# Altium footprint library AMLB_v1.PcbLib: 167 footprints (part 10 of 11)
Each footprint in its own frame and in the unit in brackets; x right, y up, seen from the top. Pads: shape width x height; smd on the part's side, far side on the other; paste and mask are expansions set on the pad; w line width, h text height; cw(c..) or ccw(c..) is an arc to the next point about the centre after c.
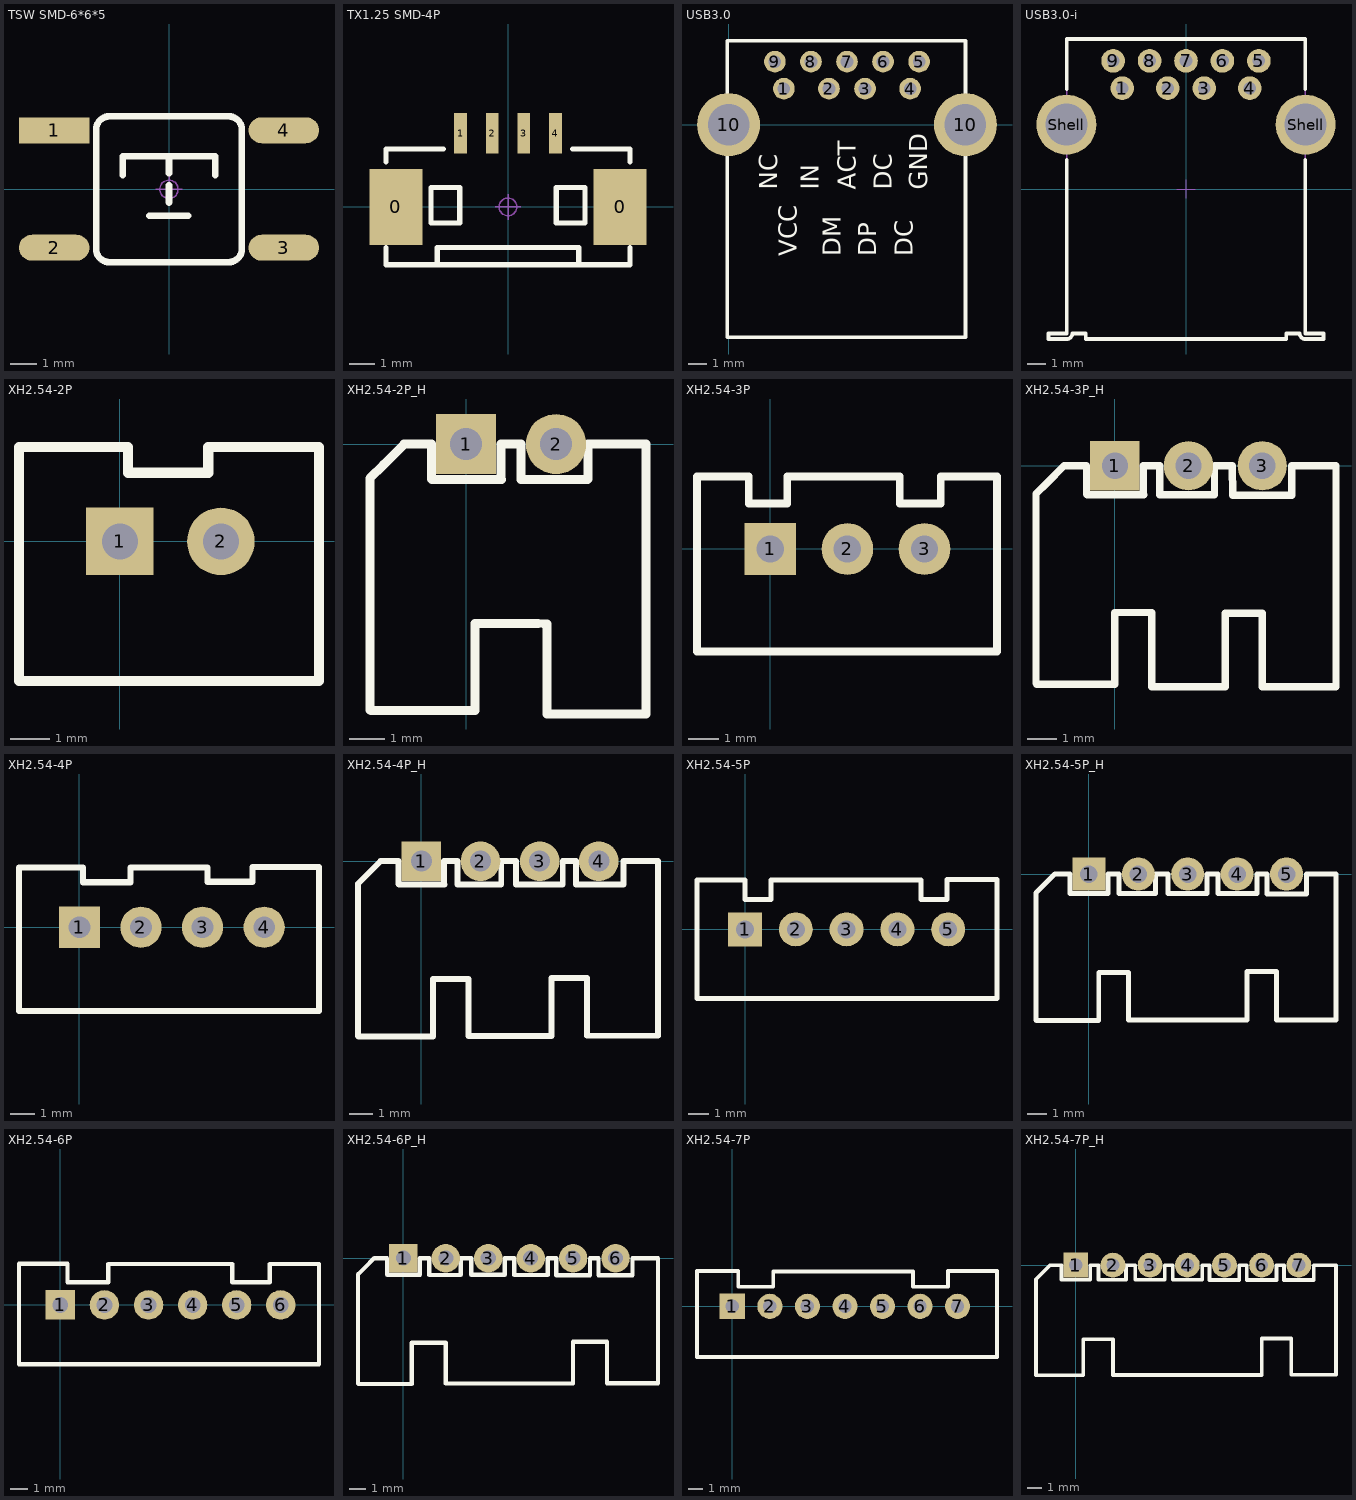
[diagram p9: the footprints below, top view; thin cyan lines are the x and y axes]

## TSW SMD-6*6*5 [mm] "6*6*5mm"
pads (4):
  rect 2.7x1 smd: 1(-4.4,2.261)
  oval 2.7x1 smd: 2(-4.4,-2.239) 3(4.4,-2.239) 4(4.4,2.261)
Top Overlay:
  lines w0.254: -1.778,0.533 -1.778,1.27 1.778,1.27 1.778,0.533 ; -0.762,-1.016 0.737,-1.016 ; 0,-0.508 0,0.152 ; 0,0.61 0,1.27 ; -2.794,-2.286 ccw(c-2.286,-2.286) -2.286,-2.794 2.286,-2.794 ccw(c2.286,-2.286) 2.794,-2.286 2.794,2.286 ccw(c2.286,2.286) 2.286,2.794 -2.286,2.794 ccw(c-2.286,2.286) -2.794,2.286 -2.794,-2.286
Mechanical 15:
  circle w0.05: c0,0 r0.35
  lines w0.05: -0.5,0 0.5,0 ; 0,-0.5 0,0.5
3D body "TSW SMD-6x6x5.STEP": height 4.95, standoff -0.03, extent -4.5,-3 4.5,3

## TX1.25 SMD-4P [mm] "4脚贴片，长：10.25mm，宽：4.4mm，高：3.5mm"
pads (6):
  rect 2.1x3 smd: 0(-4.425,0) 0(4.425,0)
  rect 0.5x1.6 smd: 1(-1.875,2.9) 2(-0.625,2.9) 3(0.625,2.9) 4(1.875,2.9)
Top Overlay:
  lines w0.2: -4.826,-1.606 -4.826,-2.286 4.826,-2.286 4.826,-1.606 ; -4.826,1.778 -4.826,2.286 -2.54,2.286 ; -2.794,-2.286 -2.794,-1.606 -2.54,-1.606 2.54,-1.606 2.794,-1.606 2.794,-2.286 ; 2.54,2.286 4.826,2.286 4.826,1.778 ; -3.048,-0.635 -1.905,-0.635 -1.905,0.762 -3.048,0.762 -3.048,-0.635 ; 1.905,-0.635 3.048,-0.635 3.048,0.762 1.905,0.762 1.905,-0.635
Mechanical 15:
  circle w0.05: c0,0 r0.35
  lines w0.05: -0.5,0 0.5,0 ; 0,-0.5 0,0.5

## USB3.0 [mm]
height 7
pads (11):
  round 1.2 hole 0.7: 1(3.07,2) 2(5.57,2) 3(7.57,2) 4(10.07,2) 5(10.57,3.5) 6(8.57,3.5) 7(6.57,3.5) 8(4.57,3.5) 9(2.57,3.5)
  round 3.5 hole 2.3: 10(0,0) 10(13.14,0)
Top Overlay:
  lines w0.2: -0.068,-11.78 -0.068,4.65 ; -0.06,-11.78 13.14,-11.78 13.14,4.65 -0.06,4.65 ; 1.74,4.65 4.315,4.65
  text "DC" at 10.211,-7.29 h1
  text "DP" at 8.204,-7.29 h1
  text "DM" at 6.223,-7.29 h1
  text "VCC" at 3.785,-7.29 h1
  text "GND" at 11.024,-3.607 h1
  text "DC" at 9.042,-3.607 h1
  text "ACT" at 7.061,-3.607 h1
  text "IN" at 5.004,-3.607 h1
  text "NC" at 2.692,-3.607 h1

## USB3.0-i [mm] "USB 3.0 Type A Horizontal"
height 6.99
pads (11):
  round 1.3 hole 0.7: 1(-3.5,5.54) 2(-1,5.54) 3(1,5.54) 4(3.5,5.54) 5(4,7.04) 6(2,7.04) 7(0,7.04) 8(-2,7.04) 9(-4,7.04)
  round 3.3 hole 2.3: Shell(-6.57,3.54) Shell(6.57,3.54)
Top Overlay:
  lines w0.2: -6.55,1.61 -6.55,-7.94 -7.55,-7.94 -7.55,-8.24 -6.56,-8.24 ccw(c-6.55,-7.94) -6.25,-7.94 -5.5,-7.94 -5.5,-8.24 5.5,-8.24 5.5,-7.94 6.25,-7.94 ccw(c6.55,-7.94) 6.56,-8.24 7.55,-8.24 7.55,-7.94 6.55,-7.94 6.55,1.61 ; -6.55,5.47 -6.55,8.24 6.55,8.24 6.55,5.47
Bottom Overlay:
  text "NC" at -4.445,0.78 h1
  text "IN" at -2.235,0.864 h1
  text "ACT" at -0.203,0.28 h1
  text "DC" at 1.753,0.78 h1
  text "GND" at 3.48,0.28 h1
  text "VCC" at -3.353,-3.649 h1
  text "DM" at -1.397,-3.15 h1
  text "DP" at 0.686,-3.15 h1
  text "DC" at 2.565,-3.15 h1
Mechanical 13:
  lines w0.1: -7.55,-8.24 -6.56,-8.24 ccw(c-6.55,-7.94) -6.25,-7.94 -5.5,-7.94 -5.5,-8.24 5.5,-8.24 5.5,-7.94 6.25,-7.94 ccw(c6.55,-7.94) 6.56,-8.24 7.55,-8.24 7.55,-7.94 6.55,-7.94 6.55,8.24 -6.55,8.24 -6.55,-7.94 -7.55,-7.94 -7.55,-8.24
Mechanical 15:
  lines w0.05: -0.5,0 0.5,0 ; 0,-0.5 0,0.5
3D body "692121030100.stp": height 8.03, standoff -3.19, extent -7.74,-8.24 7.74,8.31

## XH2.54-2P [mm] "接插件，2P"
pads (2):
  rect 1.7x1.7 hole 0.9: 1(0,0)
  round 1.7 hole 0.9: 2(2.54,0)
Top Overlay:
  lines w0.254: -2.537,-3.505 -2.537,2.37 0.203,2.37 0.203,1.727 2.223,1.727 2.223,2.37 4.224,2.37 5.006,2.37 5.006,-3.505 -2.537,-3.505
3D body "XH2.54-2P.STEP": height 7.05, standoff -2.45, extent -2.5,-3.3 5.04,2.4

## XH2.54-2P_H [mm] "接插件，2P"
pads (2):
  rect 1.7x1.7 hole 0.9: 1(0,0)
  round 1.7 hole 0.9: 2(2.54,0)
Top Overlay:
  lines w0.254: 3.434,0 3.434,-0.988 3.42,-1.002 1.554,-1.002 1.554,0 0.982,0 0.982,-0.982 0.996,-0.996 -0.96,-0.996 -0.974,-0.982 -0.974,0 -1.75,0 -2.332,-0.582 -2.716,-0.966 -2.716,-7.502 -2.69,-7.528 0.254,-7.528 0.254,-5.058 2.032,-5.058 2.286,-5.08 2.286,-7.62 2.54,-7.62 5.08,-7.62 5.08,0 4.044,0 3.446,0
3D body "XH2.54-2P_H.STEP": height 5.73, standoff -3.37, extent -2.5,-7.35 5.04,0.35

## XH2.54-3P [mm] "接插件，3P"
pads (3):
  rect 1.7x1.7 hole 0.9: 1(0,0)
  round 1.7 hole 0.9: 2(2.54,0) 3(5.08,0)
Top Overlay:
  lines w0.254: -2.413,-3.378 7.468,-3.378 7.468,2.388 5.613,2.388 5.613,1.5 4.267,1.5 4.267,2.388 0.559,2.388 0.559,1.5 -0.711,1.5 -0.711,2.388 -2.413,2.388 -2.413,-3.378
3D body "XH2.54-3P.STEP": height 7.03, standoff -2.47, extent -2.5,-3.3 7.58,2.4

## XH2.54-3P_H [mm] "接插件，3P"
pads (3):
  rect 1.7x1.7 hole 0.9: 1(0,0)
  round 1.7 hole 0.9: 2(2.54,0) 3(5.08,0)
Top Overlay:
  lines w0.254: 3.434,0 3.434,-0.988 3.42,-1.002 1.554,-1.002 1.554,0 0.982,0 0.982,-0.982 0.996,-0.996 -0.96,-0.996 -0.974,-0.982 -0.974,0 -1.75,0 -2.332,-0.582 -2.716,-0.966 -2.716,-7.502 -2.69,-7.528 0,-7.528 0,-5.058 1.27,-5.058 1.27,-7.62 2.54,-7.62 3.81,-7.62 3.81,-5.08 5.08,-5.08 5.08,-7.62 7.62,-7.62 7.62,0 6.584,0 6.096,0 6.096,-1.016 4.064,-1.016 4.044,0 3.446,0
3D body "XH2.54-3P_H.STEP": height 5.73, standoff -3.37, extent -2.5,-7.35 7.58,0.35

## XH2.54-4P [mm] "接插件，4P"
pads (4):
  rect 1.7x1.7 hole 0.9: 1(0,0)
  round 1.7 hole 0.9: 2(2.54,0) 3(5.08,0) 4(7.62,0)
Top Overlay:
  lines w0.254: -2.489,-3.454 9.881,-3.454 9.881,2.489 7.137,2.489 7.137,1.88 5.283,1.88 5.283,2.464 2.108,2.464 2.108,1.854 0.152,1.854 0.152,2.464 -2.489,2.464 -2.489,-3.454
3D body "XH2.54-4P.STEP": height 7.03, standoff -2.47, extent -2.5,-3.3 10.12,2.4

## XH2.54-4P_H [mm] "接插件，4P"
pads (4):
  rect 1.7x1.7 hole 0.9: 1(0,0)
  round 1.7 hole 0.9: 2(2.54,0) 3(5.08,0) 4(7.62,0)
Top Overlay:
  lines w0.254: 3.434,0 3.434,-0.988 3.42,-1.002 1.554,-1.002 1.554,0 0.982,0 0.982,-0.982 0.996,-0.996 -0.96,-0.996 -0.974,-0.982 -0.974,0 -1.75,0 -2.332,-0.582 -2.716,-0.966 -2.716,-7.502 -2.69,-7.528 0.508,-7.528 0.508,-5.058 2.032,-5.058 2.032,-7.502 5.588,-7.502 5.588,-5.006 7.112,-5.006 7.112,-7.49 10.16,-7.49 10.16,0 8.726,0 ; 3.446,0 4.044,0 ; 4.058,-0.996 4.058,0 ; 4.078,-0.996 6.066,-0.996 6.072,-0.99 6.072,0 6.618,0 ; 6.632,0 6.632,-1.002 8.686,-1.002 ; 8.686,-0.976 8.686,0
3D body "XH2.54-4P_H.STEP": height 5.73, standoff -3.37, extent -2.5,-7.35 10.12,0.35

## XH2.54-5P [mm] "接插件，5P"
pads (5):
  rect 1.7x1.7 hole 0.9: 1(0,0)
  round 1.7 hole 0.9: 2(2.54,0) 3(5.08,0) 4(7.62,0) 5(10.16,0)
Top Overlay:
  lines w0.254: 1.3,2.438 1.3,1.5 0,1.5 0,2.464 -2.4,2.464 -2.4,-3.454 12.6,-3.454 12.6,2.489 10.1,2.489 10.1,1.5 8.8,1.5 8.8,2.464 1.3,2.464
3D body "XH2.54-5P.STEP": height 7.03, standoff -2.47, extent -2.5,-3.3 12.66,2.4

## XH2.54-5P_H [mm] "接插件，5P"
pads (5):
  rect 1.7x1.7 hole 0.9: 1(0,0)
  round 1.7 hole 0.9: 2(2.54,0) 3(5.08,0) 4(7.62,0) 5(10.16,0)
Top Overlay:
  lines w0.254: 3.434,0 3.434,-0.988 3.42,-1.002 1.554,-1.002 1.554,0 0.982,0 0.982,-0.982 0.996,-0.996 -0.96,-0.996 -0.974,-0.982 -0.974,0 -1.75,0 -2.332,-0.582 -2.716,-0.966 -2.716,-7.502 -2.69,-7.528 0.508,-7.528 0.508,-5.058 2.032,-5.058 2.032,-7.502 8.128,-7.502 8.128,-5.006 9.652,-5.006 9.652,-7.49 12.7,-7.49 12.7,0 11.176,0 11.176,-1.016 9.144,-1.016 9.144,0 8.636,0 8.636,-1.002 6.632,-1.002 6.632,0 ; 3.446,0 4.044,0 ; 4.058,-0.996 4.058,0 ; 4.078,-0.996 6.066,-0.996 6.072,-0.99 6.072,0 6.618,0
3D body "XH2.54-5P_H.STEP": height 5.73, standoff -3.37, extent -2.5,-7.35 12.66,0.35

## XH2.54-6P [mm] "接插件，6P"
pads (6):
  rect 1.7x1.7 hole 0.9: 1(0,0)
  round 1.7 hole 0.9: 2(2.54,0) 3(5.08,0) 4(7.62,0) 5(10.16,0) 6(12.7,0)
Top Overlay:
  lines w0.254: -2.388,-3.429 14.91,-3.429 14.91,2.362 12.065,2.362 12.065,1.321 9.906,1.321 9.906,2.362 2.769,2.362 2.769,1.321 0.406,1.321 0.406,2.388 -2.388,2.388 -2.388,-3.429
3D body "XH2.54-6P.STEP": height 7.03, standoff -2.47, extent -2.5,-3.3 15.2,2.4

## XH2.54-6P_H [mm] "接插件，6P"
pads (6):
  rect 1.7x1.7 hole 0.9: 1(0,0)
  round 1.7 hole 0.9: 2(2.54,0) 3(5.08,0) 4(7.62,0) 5(10.16,0) 6(12.7,0)
Top Overlay:
  lines w0.254: 3.434,0 3.434,-0.988 3.42,-1.002 1.554,-1.002 1.554,0 0.982,0 0.982,-0.982 0.996,-0.996 -0.96,-0.996 -0.974,-0.982 -0.974,0 -1.75,0 -2.332,-0.582 -2.716,-0.966 -2.716,-7.502 -2.69,-7.528 0.508,-7.528 0.508,-5.058 2.54,-5.058 2.54,-7.502 10.16,-7.502 10.16,-5.006 12.192,-5.006 12.192,-7.49 15.24,-7.49 15.24,0 13.716,0 13.716,-1.016 11.684,-1.016 11.684,0 11.176,0 11.176,-1.016 9.144,-1.016 9.144,0 8.636,0 8.636,-1.002 6.632,-1.002 6.632,0 ; 3.446,0 4.044,0 ; 4.058,-0.996 4.058,0 ; 4.078,-0.996 6.066,-0.996 6.072,-0.99 6.072,0 6.618,0
3D body "XH2.54-6P_H.STEP": height 5.75, standoff -3.35, extent -2.5,-7.35 15.2,0.35

## XH2.54-7P [mm] "接插件，7P"
pads (7):
  rect 1.7x1.7 hole 0.9: 1(0,0)
  round 1.7 hole 0.9: 2(2.54,0) 3(5.08,0) 4(7.62,0) 5(10.16,0) 6(12.7,0) 7(15.24,0)
Top Overlay:
  lines w0.254: -2.388,-3.429 -2.388,2.388 0.406,2.388 0.406,1.321 2.769,1.321 2.769,2.362 9.906,2.362 12.231,2.362 12.231,1.321 14.594,1.321 14.594,2.388 17.907,2.388 17.907,-3.429 14.91,-3.429 -2.388,-3.429
3D body "XH2.54-7P.STEP": height 7.05, standoff -2.45, extent -2.5,-3.302 17.74,2.398

## XH2.54-7P_H [mm] "接插件，7P"
pads (7):
  rect 1.7x1.7 hole 0.9: 1(0,0)
  round 1.7 hole 0.9: 2(2.54,0) 3(5.08,0) 4(7.62,0) 5(10.16,0) 6(12.7,0) 7(15.24,0)
Top Overlay:
  lines w0.254: 3.434,0 3.434,-0.988 3.42,-1.002 1.554,-1.002 1.554,0 0.982,0 0.982,-0.982 0.996,-0.996 -0.96,-0.996 -0.974,-0.982 -0.974,0 -1.75,0 -2.332,-0.582 -2.716,-0.966 -2.716,-7.502 -2.69,-7.528 0.508,-7.528 0.508,-5.058 2.54,-5.058 2.54,-7.502 12.7,-7.502 12.7,-5.006 14.732,-5.006 14.732,-7.49 17.78,-7.49 17.78,0 16.256,0 16.256,-1.016 14.224,-1.016 14.224,0 13.716,0 13.716,-1.016 11.684,-1.016 11.684,0 11.176,0 11.176,-1.016 9.144,-1.016 9.144,0 8.636,0 8.636,-1.002 6.632,-1.002 6.632,0 ; 3.446,0 4.044,0 ; 4.058,-0.996 4.058,0 ; 4.078,-0.996 6.066,-0.996 6.072,-0.99 6.072,0 6.618,0
3D body "XH2.54-7P_H.STEP": height 5.75, standoff -3.35, extent -2.5,-7.35 17.74,0.35